# Altium footprint library Hydrolib_pcb.PcbLib: 97 footprints (part 7 of 7)
Each footprint in its own frame and in the unit in brackets; x right, y up, seen from the top. Pads: shape width x height; smd on the part's side, far side on the other; paste and mask are expansions set on the pad; w line width, h text height; cw(c..) or ccw(c..) is an arc to the next point about the centre after c.
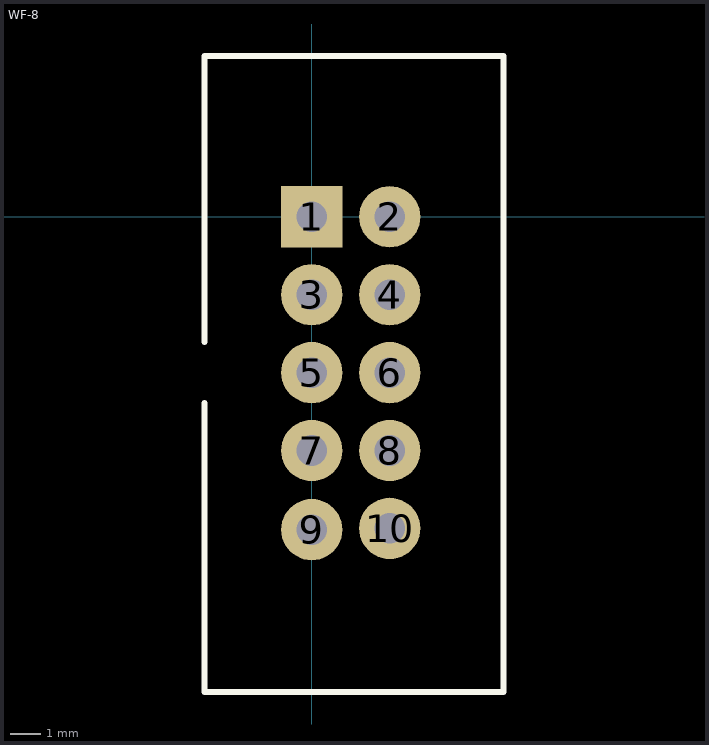
[diagram p6: the footprint, top view; thin cyan lines are the x and y axes]

## WF-8 [mm] "IDC-10 Male Connector"
height 9
pads (10):
  rect 2x2 hole 1: 1(0,0)
  round 2 hole 1: 2(2.54,0) 3(0,-2.54) 4(2.54,-2.54) 5(0,-5.08) 6(2.54,-5.08) 7(0,-7.62) 8(2.54,-7.62) 9(0,-10.2) 10(2.54,-10.16)
Top Overlay:
  lines w0.2: -3.5,-6.075 -3.5,-15.5 6.25,-15.5 6.25,5.25 -3.5,5.25 -3.5,-4.075
3D body "User Library-BH-10__64BH-10.STEP": height 9.1, standoff -3, extent -3.83,-15.325 5.47,5.175